# Altium footprint library ICs And Semiconductors SMD.PcbLib: 943 footprints (part 5 of 60)
Each footprint in its own frame and in the unit in brackets; x right, y up, seen from the top. Pads: shape width x height; smd on the part's side, far side on the other; paste and mask are expansions set on the pad; w line width, h text height; cw(c..) or ccw(c..) is an arc to the next point about the centre after c.
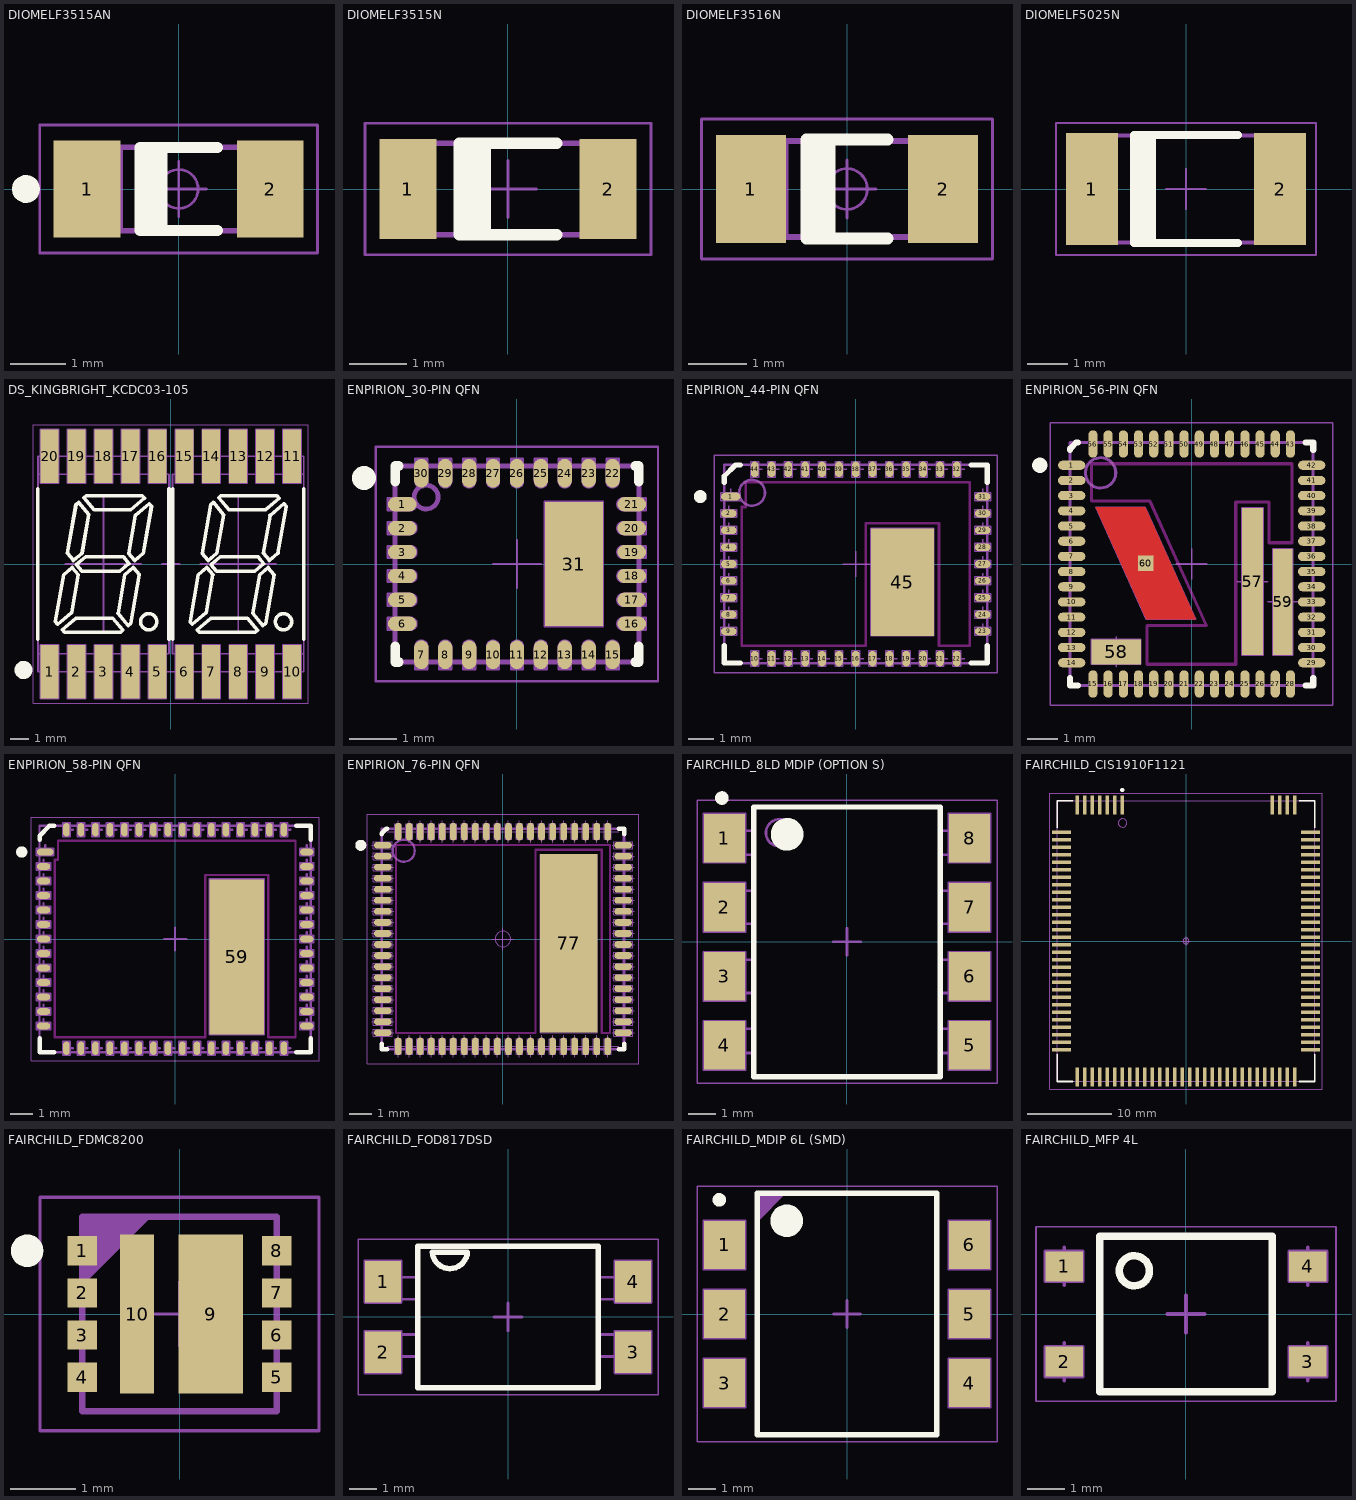
[diagram p4: the footprints below, top view; thin cyan lines are the x and y axes]

## DIOMELF3515AN [mm] "SOD80, MELF Diode, 2-Leads, Body 3.5x1.5mm, IPC Medium Density"
height 1.6
pads (2):
  rect 1.2x1.75 smd: 1(-1.65,0) 2(1.65,0)
Top Overlay:
  circle w0.25: c-2.75,0 r0.125
  lines w0.2: -0.5,-0.75 -0.5,0.75 ; -0.3,-0.75 -0.3,0.75 ; 0.7,-0.75 -0.7,-0.75 -0.7,0.75 0.7,0.75
Mechanical 14:
  lines w0.1: -1.65,-0.75 -1.65,0.75 ; -1.55,-0.75 -1.55,0.75 ; -1.45,-0.75 -1.45,0.75 ; -1.35,-0.75 -1.35,0.75 ; -1.25,-0.75 -1.25,0.75 ; -1.15,-0.75 -1.15,0.75 ; -1.05,-0.75 -1.05,0.75 ; -1.75,-0.75 1.75,-0.75 1.75,0.75 -1.75,0.75 ; -1.75,-0.75 -1.75,0.75 ; -1.75,-0.75 -1.75,0.75
Mechanical 15:
  circle w0.05: c0,0 r0.35
  lines w0.05: -0.5,0 0.5,0 ; 0,-0.5 0,0.5 ; -2.5,-1.15 2.5,-1.15 2.5,1.15 -2.5,1.15 -2.5,-1.15
3D body "DIOMELF3515AN.stp": height 1.6, standoff 0, extent -1.85,-0.8 1.85,0.8

## DIOMELF3515N [mm] "SOD80C, MELF Diode, 2-Leads, Body 3.5x1.5mm, IPC Medium Density"
height 1.6
pads (2):
  rect 1x1.75 smd: 1(-1.75,0) 2(1.75,0)
Top Overlay:
  rectangle: -0.85,-0.8 -0.3,0.8
  lines w0.2: 0.85,-0.8 -0.85,-0.8 -0.85,0.8 0.85,0.8
Mechanical 14:
  lines w0.1: -1.802,-0.8 -1.802,0.8 ; -1.727,-0.8 -1.727,0.8 ; -1.652,-0.8 -1.652,0.8 ; -1.577,-0.8 -1.577,0.8 ; -1.502,-0.8 -1.502,0.8 ; -1.427,-0.8 -1.427,0.8 ; -1.352,-0.8 -1.352,0.8 ; -1.85,-0.8 -1.85,0.8 1.85,0.8 1.85,-0.8 -1.85,-0.8
Mechanical 15:
  lines w0.05: -0.5,0 0.5,0 ; 0,-0.5 0,0.5 ; -2.5,-1.15 -2.5,1.15 2.5,1.15 2.5,-1.15 -2.5,-1.15
3D body "DIOMELF3515N.stp": height 1.6, standoff 0, extent -1.85,-0.8 1.85,0.8

## DIOMELF3516N [mm] "SOD80, Diode, MELF; 3.50mm L X 1.65mm Dia, IPC Medium Density"
height 1.6
pads (2):
  rect 1.2x1.85 smd: 1(-1.65,0) 2(1.65,0)
Top Overlay:
  lines w0.2: -0.5,-0.85 -0.5,0.85 ; -0.3,-0.85 -0.3,0.85 ; 0.7,-0.85 -0.7,-0.85 -0.7,0.85 0.7,0.85
Mechanical 14:
  lines w0.1: -1.65,-0.825 -1.65,0.825 ; -1.55,-0.825 -1.55,0.825 ; -1.45,-0.825 -1.45,0.825 ; -1.35,-0.825 -1.35,0.825 ; -1.25,-0.825 -1.25,0.825 ; -1.15,-0.825 -1.15,0.825 ; -1.05,-0.825 -1.05,0.825 ; -1.75,-0.825 1.75,-0.825 1.75,0.825 -1.75,0.825 ; -1.75,-0.825 -1.75,0.825 ; -1.75,-0.825 -1.75,0.825
Mechanical 15:
  circle w0.05: c0,0 r0.35
  lines w0.05: -0.5,0 0.5,0 ; 0,-0.5 0,0.5 ; -2.5,-1.2 2.5,-1.2 2.5,1.2 -2.5,1.2 -2.5,-1.2
3D body "DIOMELF3516N.stp": height 1.7, standoff 0, extent -1.85,-0.8 1.65,0.9

## DIOMELF5025N [mm] "DO-213-AB, MELF Diode, 2-Leads, Body 5.0x2.5mm, IPC Medium Density"
height 2.7
pads (2):
  rect 1.3x2.8 smd: 1(-2.35,0) 2(2.35,0)
Top Overlay:
  rectangle: -1.3,-1.35 -0.75,1.35
  lines w0.2: 1.3,-1.35 -1.3,-1.35 -1.3,1.35 1.3,1.35
Mechanical 14:
  lines w0.1: -2.5,-1.335 -2.5,1.335 ; -2.4,-1.335 -2.4,1.335 ; -2.3,-1.335 -2.3,1.335 ; -2.2,-1.335 -2.2,1.335 ; -2.1,-1.335 -2.1,1.335 ; -2,-1.335 -2,1.335 ; -2.6,-1.335 2.6,-1.335 2.6,1.335 -2.6,1.335 -2.6,-1.335
Mechanical 15:
  lines w0.05: -0.5,0 0.5,0 ; 0,-0.5 0,0.5 ; -3.25,-1.65 3.25,-1.65 3.25,1.65 -3.25,1.65 -3.25,-1.65
3D body "DIOMELF5025N.stp": height 2.67, standoff 0, extent -2.6,-1.335 2.6,1.335

## DS_KINGBRIGHT_KCDC03-105 [mm] "20-Leads, Body 14.8x12mm, Pitch 1.5mm, Hyper Red SMD Common Cathode Dual 7-SegmentDisplay"
height 1.2
pads (20):
  rect 1x3 smd: 1(-6.75,-6) 2(-5.25,-6) 3(-3.75,-6) 4(-2.25,-6) 5(-0.75,-6) 6(0.75,-6) 7(2.25,-6) 8(3.75,-6) 9(5.25,-6) 10(6.75,-6) 11(6.75,6) 12(5.25,6) 13(3.75,6) 14(2.25,6) 15(0.75,6) 16(-0.75,6) 17(-2.25,6) 18(-3.75,6) 19(-5.25,6) 20(-6.75,6)
Top Overlay:
  circle w0.2: c-1.227,-3.215 r0.45
  circle w0.2: c6.273,-3.215 r0.45
  circle w0.5: c-8.2,-5.9 r0.25
  lines w0.2: -0.1,-4.2 -0.1,4.2 ; 0.1,-4.2 0.1,4.2 ; -7.4,-4.2 -7.4,4.2 ; -7.4,-4.2 -7.4,4.2 ; -7.4,-4.2 -7.4,4.2 ; 7.4,-4.2 7.4,4.2 ; 7.4,-4.2 7.4,4.2 ; 7.4,-4.2 7.4,4.2 ; -6.425,-3.206 -6.301,-3.354 -5.524,-2.703 -5.153,-0.597 -5.489,-0.197 -5.965,-0.597 -6.425,-3.206 ; -6.034,-3.662 -5.909,-3.81 -2.815,-3.81 -2.667,-3.686 -3.233,-3.01 -5.257,-3.01 -6.034,-3.662 ; -5.755,0.597 -5.278,3.303 -5.129,3.428 -4.562,2.752 -4.942,0.597 -5.419,0.197 -5.755,0.597 ; -5.257,-0.035 -4.739,0.4 -2.643,0.4 -2.328,0.025 -2.834,-0.4 -4.95,-0.4 -5.257,-0.035 ; -4.833,3.686 -4.685,3.81 -1.591,3.81 -1.466,3.662 -2.243,3.01 -4.266,3.01 -4.833,3.686 ; -2.938,-2.752 -2.37,-3.428 -2.223,-3.304 -1.745,-0.597 -2.081,-0.197 -2.558,-0.597 -2.938,-2.752 ; -2.347,0.597 -1.976,2.703 -1.199,3.354 -1.075,3.206 -1.535,0.597 -2.011,0.197 -2.347,0.597 ; 1.075,-3.206 1.199,-3.354 1.976,-2.703 2.347,-0.597 2.011,-0.197 1.535,-0.597 1.075,-3.206 ; 1.466,-3.662 1.591,-3.81 4.685,-3.81 4.833,-3.686 4.267,-3.01 2.243,-3.01 1.466,-3.662 ; 1.745,0.597 2.222,3.303 2.371,3.428 2.938,2.752 2.558,0.597 2.081,0.197 1.745,0.597 ; 2.243,-0.035 2.761,0.4 4.857,0.4 5.172,0.025 4.666,-0.4 2.55,-0.4 2.243,-0.035 ; 2.667,3.686 2.815,3.81 5.909,3.81 6.034,3.662 5.257,3.01 3.234,3.01 2.667,3.686 ; 4.562,-2.752 5.13,-3.428 5.277,-3.304 5.755,-0.597 5.419,-0.197 4.942,-0.597 4.562,-2.752 ; 5.153,0.597 5.524,2.703 6.301,3.354 6.425,3.206 5.965,0.597 5.489,0.197 5.153,0.597
Mechanical 8:
  drawing of 172 lines, arcs and shapes, not listed
Mechanical 14:
  drawing of 422 lines, arcs and shapes, not listed
Mechanical 15:
  lines w0.05: -7.65,-7.75 -7.65,7.75 7.65,7.75 7.65,-7.75 -7.65,-7.75
3D body "DS_KINGBRIGHT_KCDC03-105.stp": height 3.75, standoff 0, extent -7.4,-6 7.4,6

## ENPIRION_30-PIN QFN [mm] "QFN, 0.50mm pitch, square; 30 pin, 5mm L X 4mm W X1.9mm H body (w/thermal tab 1.215mm x 2.6mm)"
height 1.9
pads (31):
  oval 0.6x0.3 smd: 1(-2.4,1.25) 2(-2.4,0.75) 3(-2.4,0.25) 4(-2.4,-0.25) 5(-2.4,-0.75) 6(-2.4,-1.25) 16(2.4,-1.25) 17(2.4,-0.75) 18(2.4,-0.25) 19(2.4,0.25) 20(2.4,0.75) 21(2.4,1.25)
  oval 0.3x0.6 smd: 7(-2,-1.9) 8(-1.5,-1.9) 9(-1,-1.9) 10(-0.5,-1.9) 11(0,-1.9) 12(0.5,-1.9) 13(1,-1.9) 14(1.5,-1.9) 15(2,-1.9) 22(2,1.9) 23(1.5,1.9) 24(1,1.9) 25(0.5,1.9) 26(0,1.9) 27(-0.5,1.9) 28(-1,1.9) 29(-1.5,1.9) 30(-2,1.9)
  rect 1.215x2.6 smd: 31(1.192,0)
Top Overlay:
  circle w0.25: c-3.2,1.8 r0.125
  lines w0.2: -2.55,-1.725 -2.55,-2.05 -2.475,-2.05 ; -2.55,1.725 -2.55,2.05 -2.475,2.05 ; 2.475,-2.05 2.55,-2.05 2.55,-1.725 ; 2.475,2.05 2.55,2.05 2.55,1.725
Mechanical 8:
  drawing of 193 lines, arcs and shapes, not listed
Mechanical 14:
  circle w0.1: c-1.9,1.4 r0.25
  lines w0.1: -2.55,-2.05 -2.55,2.05 2.55,2.05 2.55,-2.05 -2.55,-2.05
Mechanical 15:
  lines w0.05: -2.95,-2.45 -2.95,2.45 2.95,2.45 2.95,-2.45 -2.95,-2.45
3D body "ENPIRION_30-PIN QFN.stp": height 1.9, standoff 0, extent -2.55,-2.05 2.55,2.05

## ENPIRION_44-PIN QFN [mm] "QFN, 0.65mm pitch, square; 44 pin, 10mm L X 7.5mm W X 1.9mm H body (w/thermal tab 2.425mm x 4.15mm), IPC Medium Density"
height 1.9
pads (45):
  oval 0.75x0.3 smd: 1(-4.825,2.6)
  oval 0.6x0.3 smd: 2(-4.9,1.95) 3(-4.9,1.3) 4(-4.9,0.65) 5(-4.9,0) 6(-4.9,-0.65) 7(-4.9,-1.3) 8(-4.9,-1.95) 9(-4.9,-2.6) 23(4.9,-2.6) 24(4.9,-1.95) 25(4.9,-1.3) 26(4.9,-0.65) 27(4.9,0) 28(4.9,0.65) 29(4.9,1.3) 30(4.9,1.95) 31(4.9,2.6)
  oval 0.3x0.6 smd: 10(-3.9,-3.65) 11(-3.25,-3.65) 12(-2.6,-3.65) 13(-1.95,-3.65) 14(-1.3,-3.65) 15(-0.65,-3.65) 16(0,-3.65) 17(0.65,-3.65) 18(1.3,-3.65) 19(1.95,-3.65) 20(2.6,-3.65) 21(3.25,-3.65) 22(3.9,-3.65) 32(3.9,3.65) 33(3.25,3.65) 34(2.6,3.65) 35(1.95,3.65) 36(1.3,3.65) 37(0.65,3.65) 38(0,3.65) 39(-0.65,3.65) 40(-1.3,3.65) 41(-1.95,3.65) 42(-2.6,3.65) 43(-3.25,3.65) 44(-3.9,3.65)
  rect 2.425x4.15 smd: 45(1.801,-0.7)
Top Layer keep-out:
  lines w0.1: -4.4,-3.15 -4.4,2.2 -4.25,2.2 -4.25,3.15 4.4,3.15 4.4,-3.15 3.213,-3.15 3.213,1.575 0.388,1.575 0.388,-3.15 -4.4,-3.15
Top Overlay:
  circle w0.25: c-6,2.6 r0.125
  lines w0.2: -5.075,-3.225 -5.075,-3.825 ; -5.075,-3.15 -5.075,-3.825 ; -5.075,3.15 -5.075,3.385 ; -5.075,3.225 -5.075,3.385 ; -4.45,-3.825 -5.075,-3.825 ; -4.45,3.825 -4.635,3.825 -5.075,3.385 ; 4.45,-3.825 5.075,-3.825 5.075,-3.15 ; 4.45,3.825 5.075,3.825 5.075,3.15
Mechanical 8:
  drawing of 278 lines, arcs and shapes, not listed
Mechanical 14:
  circle w0.1: c-4,2.75 r0.5
  lines w0.1: -5.075,-3.825 -5.075,3.825 5.075,3.825 5.075,-3.825 -5.075,-3.825
Mechanical 15:
  lines w0.05: -5.45,-4.2 5.45,-4.2 5.45,4.2 -5.45,4.2 -5.45,-4.2
3D body "ENPIRION_44-PIN QFN.stp": height 1.9, standoff 0, extent -5.075,-3.825 5.075,3.825

## ENPIRION_56-PIN QFN [mm] "QFN, 0.50mm pitch, square; 56 pin, 8mm L X 8mm W X 3mm H body (w/multiple thermal tab)"
height 3.05
pads (60):
  oval 0.9x0.3 smd: 1(-3.95,3.25) 2(-3.95,2.75) 3(-3.95,2.25) 4(-3.95,1.75) 5(-3.95,1.25) 6(-3.95,0.75) 7(-3.95,0.25) 8(-3.95,-0.25) 9(-3.95,-0.75) 10(-3.95,-1.25) 11(-3.95,-1.75) 12(-3.95,-2.25) 13(-3.95,-2.75) 14(-3.95,-3.25) 29(3.95,-3.25) 30(3.95,-2.75) 31(3.95,-2.25) 32(3.95,-1.75) 33(3.95,-1.25) 34(3.95,-0.75) 35(3.95,-0.25) 36(3.95,0.25) 37(3.95,0.75) 38(3.95,1.25) 39(3.95,1.75) 40(3.95,2.25) 41(3.95,2.75) 42(3.95,3.25)
  oval 0.3x0.9 smd: 15(-3.25,-3.95) 16(-2.75,-3.95) 17(-2.25,-3.95) 18(-1.75,-3.95) 19(-1.25,-3.95) 20(-0.75,-3.95) 21(-0.25,-3.95) 22(0.25,-3.95) 23(0.75,-3.95) 24(1.25,-3.95) 25(1.75,-3.95) 26(2.25,-3.95) 27(2.75,-3.95) 28(3.25,-3.95) 43(3.25,3.95) 44(2.75,3.95) 45(2.25,3.95) 46(1.75,3.95) 47(1.25,3.95) 48(0.75,3.95) 49(0.25,3.95) 50(-0.25,3.95) 51(-0.75,3.95) 52(-1.25,3.95) 53(-1.75,3.95) 54(-2.25,3.95) 55(-2.75,3.95) 56(-3.25,3.95)
  rect 0.7x4.84 smd: 57(2,-0.577)
  rect 1.625x0.82 smd: 58(-2.488,-2.89)
  rect 0.65x3.5 smd: 59(3,-1.25)
  rect 0.5x0.5 smd: 60(-1.51,0.023)
Top Layer:
  region: -3.153,1.868 -1.522,1.868 -0.673,-0.025 0.133,-1.822 -1.498,-1.822
Top Layer keep-out:
  lines w0.1: 0.479,-2.021 -1.376,2.068 -3.3,2.068 -3.3,3.3 3.3,3.3 3.3,0.7 2.55,0.7 2.55,2.043 1.45,2.043 1.45,-3.3 -1.475,-3.3 -1.475,-2.022 0.481,-2.022
Top Overlay:
  circle w0.25: c-5,3.25 r0.125
  lines w0.2: -4,-3.75 -4,-4 -3.75,-4 ; -4,3.75 -4,3.8 -3.8,4 -3.75,4 ; 3.75,-4 4,-4 4,-3.75 ; 3.75,4 4,4 4,3.75
Mechanical 8:
  lines w0.05: -2.987,-2.89 -2.488,-2.89 ; -2.488,-3.39 -2.488,-2.89 ; -2.488,-2.39 -2.488,-2.89 ; -2.01,0.023 -1.51,0.023 ; -1.987,-2.89 -2.488,-2.89 ; -1.51,-0.477 -1.51,0.023 ; -1.51,0.523 -1.51,0.023 ; -1.01,0.023 -1.51,0.023 ; -0.5,0 0,0 ; 0,-0.5 0,0 ; 0,0.5 0,0 ; 0.5,0 0,0 ; 1.5,-0.577 2,-0.577 ; 2,-1.078 2,-0.577 ; 2,-0.078 2,-0.577 ; 2.5,-1.25 3,-1.25 ; 2.5,-0.577 2,-0.577 ; 3,-1.75 3,-1.25 ; 3,-0.75 3,-1.25 ; 3.5,-1.25 3,-1.25 ; -3.153,1.868 -1.522,1.868 ; -3.153,1.868 -1.498,-1.822 ; -3.153,1.868 -1.498,-1.822 ; -3.153,1.868 -1.522,1.868 ; -1.675,-3.3 -3.3,-3.3 -3.3,-2.48 -1.675,-2.48 ; -1.675,-3.3 -1.675,-2.48 ; -1.675,-3.3 -1.675,-2.48 ; -1.522,1.868 0.133,-1.822 ; -1.522,1.868 0.133,-1.822 ; -1.498,-1.822 0.133,-1.822 ; -1.498,-1.822 0.133,-1.822 ; 1.65,-3 2.35,-3 2.35,1.845 1.65,1.845 1.65,-3 ; 2.675,-3 3.325,-3 3.325,0.5 2.675,0.5 2.675,-3
Mechanical 14:
  circle w0.1: c-3,3 r0.5
  lines w0.1: -4,-4 -4,4 4,4 4,-4 -4,-4
Mechanical 15:
  lines w0.05: -4.65,-4.65 -4.65,4.65 4.65,4.65 4.65,-4.65 -4.65,-4.65
3D body "ENPIRION_56-PIN QFN.stp": height 3.05, standoff 0, extent -4,-4 4,4

## ENPIRION_58-PIN QFN [mm] "QFN, 0.65mm pitch, square; 58 pin, 12mm L X 10mm W X 1.95mm H body (w/thermal tab 6.955mm x 4.425mm), IPC Medium Density"
height 1.95
pads (59):
  oval 0.75x0.3 smd: 1(-5.825,3.9)
  oval 0.6x0.3 smd: 2(-5.9,3.25) 3(-5.9,2.6) 4(-5.9,1.95) 5(-5.9,1.3) 6(-5.9,0.65) 7(-5.9,0) 8(-5.9,-0.65) 9(-5.9,-1.3) 10(-5.9,-1.95) 11(-5.9,-2.6) 12(-5.9,-3.25) 13(-5.9,-3.9) 30(5.9,-3.9) 31(5.9,-3.25) 32(5.9,-2.6) 33(5.9,-1.95) 34(5.9,-1.3) 35(5.9,-0.65) 36(5.9,0) 37(5.9,0.65) 38(5.9,1.3) 39(5.9,1.95) 40(5.9,2.6) 41(5.9,3.25) 42(5.9,3.9)
  oval 0.3x0.6 smd: 14(-4.875,-4.9) 15(-4.225,-4.9) 16(-3.575,-4.9) 17(-2.925,-4.9) 18(-2.275,-4.9) 19(-1.625,-4.9) 20(-0.975,-4.9) 21(-0.325,-4.9) 22(0.325,-4.9) 23(0.975,-4.9) 24(1.625,-4.9) 25(2.275,-4.9) 26(2.925,-4.9) 27(3.575,-4.9) 28(4.225,-4.9) 29(4.875,-4.9) 43(4.875,4.9) 44(4.225,4.9) 45(3.575,4.9) 46(2.925,4.9) 47(2.275,4.9) 48(1.625,4.9) 49(0.975,4.9) 50(0.325,4.9) 51(-0.325,4.9) 52(-0.975,4.9) 53(-1.625,4.9) 54(-2.275,4.9) 55(-2.925,4.9) 56(-3.575,4.9) 57(-4.225,4.9) 58(-4.875,4.9)
  rect 2.425x6.95 smd: 59(2.763,-0.8)
Top Layer keep-out:
  lines w0.1: -5.4,-4.4 -5.4,3.55 -5.25,3.55 -5.25,4.4 5.4,4.4 5.4,-4.4 4.175,-4.4 4.175,2.875 1.35,2.875 1.35,-4.4 -5.4,-4.4
Top Overlay:
  circle w0.25: c-6.875,3.9 r0.125
  lines w0.2: -6.075,-4.45 -6.075,-5.075 -5.425,-5.075 ; -6.075,4.45 -6.075,4.635 -5.635,5.075 -5.425,5.075 ; 5.425,-5.075 6.075,-5.075 6.075,-4.45 ; 5.425,5.075 6.075,5.075 6.075,4.45
Top Paste:
  region: 2.183,0.45 3.343,0.45 3.343,2.35 2.183,2.35
  region: 2.183,-1.75 3.343,-1.75 3.343,0.15 2.183,0.15
  region: 2.183,-3.95 3.343,-3.95 3.343,-2.05 2.183,-2.05
Mechanical 8:
  drawing of 360 lines, arcs and shapes, not listed
Mechanical 14:
  lines w0.1: -6.075,-5.075 6.075,-5.075 6.075,5.075 -6.075,5.075 -6.075,-5.075
Mechanical 15:
  lines w0.05: -6.45,-5.45 -6.45,5.45 6.45,5.45 6.45,-5.45 -6.45,-5.45
3D body "ENPIRION_58-PIN QFN.stp": height 1.95, standoff 0, extent -6.075,-5.075 6.075,5.075

## ENPIRION_76-PIN QFN [mm] "QFP, 0.50mm Pitch, Square; 18 pin X 20 Pin, 10.00mm X 11.00mm (W/Thermal Tab 2.6mm X 8.1mm)"
height 3.05
pads (77):
  oval 0.8x0.3 smd: 1(-5.45,4.25) 2(-5.45,3.75) 3(-5.45,3.25) 4(-5.45,2.75) 5(-5.45,2.25) 6(-5.45,1.75) 7(-5.45,1.25) 8(-5.45,0.75) 9(-5.45,0.25) 10(-5.45,-0.25) 11(-5.45,-0.75) 12(-5.45,-1.25) 13(-5.45,-1.75) 14(-5.45,-2.25) 15(-5.45,-2.75) 16(-5.45,-3.25) 17(-5.45,-3.75) 18(-5.45,-4.25) 39(5.45,-4.25) 40(5.45,-3.75) 41(5.45,-3.25) 42(5.45,-2.75) 43(5.45,-2.25) 44(5.45,-1.75) 45(5.45,-1.25) 46(5.45,-0.75) 47(5.45,-0.25) 48(5.45,0.25) 49(5.45,0.75) 50(5.45,1.25) 51(5.45,1.75) 52(5.45,2.25) 53(5.45,2.75) 54(5.45,3.25) 55(5.45,3.75) 56(5.45,4.25)
  oval 0.3x0.8 smd: 19(-4.75,-4.867) 20(-4.25,-4.867) 21(-3.75,-4.867) 22(-3.25,-4.867) 23(-2.75,-4.867) 24(-2.25,-4.867) 25(-1.75,-4.867) 26(-1.25,-4.867) 27(-0.75,-4.867) 28(-0.25,-4.867) 29(0.25,-4.867) 30(0.75,-4.867) 31(1.25,-4.867) 32(1.75,-4.867) 33(2.25,-4.867) 34(2.75,-4.867) 35(3.25,-4.867) 36(3.75,-4.867) 37(4.25,-4.867) 38(4.75,-4.867) 57(4.75,4.867) 58(4.25,4.867) 59(3.75,4.867) 60(3.25,4.867) 61(2.75,4.867) 62(2.25,4.867) 63(1.75,4.867) 64(1.25,4.867) 65(0.75,4.867) 66(0.25,4.867) 67(-0.25,4.867) 68(-0.75,4.867) 69(-1.25,4.867) 70(-1.75,4.867) 71(-2.25,4.867) 72(-2.75,4.867) 73(-3.25,4.867) 74(-3.75,4.867) 75(-4.25,4.867) 76(-4.75,4.867)
  rect 2.6x8.1 smd: 77(2.98,-0.2)
Top Layer keep-out:
  lines w0.1: -4.85,-4.267 1.48,-4.267 1.48,4.05 4.48,4.05 4.48,-4.267 4.85,-4.267 4.85,4.267 -4.85,4.267 -4.85,-4.267
Top Overlay:
  circle w0.25: c-6.447,4.25 r0.125
  lines w0.2: -5.497,-4.75 -5.497,-5 -5.247,-5 ; -5.497,4.75 -5.497,4.8 -5.297,5 -5.247,5 ; 5.253,-5 5.503,-5 5.503,-4.75 ; 5.253,5 5.503,5 5.503,4.75
Top Paste:
  region: 2.18,-3.65 2.18,-2.35 3.779,-2.35 3.779,-3.65
  region: 2.18,-1.75 2.18,-0.45 3.779,-0.45 3.779,-1.75
  region: 2.18,0.05 2.18,1.35 3.779,1.35 3.779,0.05
  region: 2.18,1.95 2.18,3.25 3.779,3.25 3.779,1.95
Mechanical 8:
  drawing of 585 lines, arcs and shapes, not listed
Mechanical 14:
  circle w0.1: c-4.497,4 r0.5
  lines w0.1: -5.497,-5 -5.497,5 5.503,5 5.503,-5 -5.497,-5
Mechanical 15:
  lines w0.05: -6.147,-5.65 -6.147,5.65 6.153,5.65 6.153,-5.65 -6.147,-5.65
3D body "ENPIRION_76-PIN QFN.stp": height 3.05, standoff 0, extent -5.5,-5 5.5,5

## FAIRCHILD_8LD MDIP (OPTION S) [mm] "DIP Gull Wing Surface Mount, 8-Leads, Body 9.65x6.6mm, Pitch 2.54mm, FAIRCHILD 8LD MDIP"
height 5.08
pads (8):
  rect 1.52x1.78 smd: 1(-4.505,3.81) 2(-4.505,1.27) 3(-4.505,-1.27) 4(-4.505,-3.81) 5(4.505,-3.81) 6(4.505,-1.27) 7(4.505,1.27) 8(4.505,3.81)
Top Overlay:
  circle w0.25: c-4.6,5.285 r0.125
  circle w0.6: c-2.2,3.95 r0.3
  lines w0.2: -3.43,-4.955 3.43,-4.955 3.43,4.955 -3.43,4.955 -3.43,-4.955
Mechanical 8:
  lines w0.1: -5.005,-3.81 -4.505,-3.81 ; -5.005,-1.27 -4.505,-1.27 ; -5.005,1.27 -4.505,1.27 ; -5.005,3.81 -4.505,3.81 ; -4.505,-4.31 -4.505,-3.81 ; -4.505,-3.31 -4.505,-3.81 ; -4.505,-1.77 -4.505,-1.27 ; -4.505,-0.77 -4.505,-1.27 ; -4.505,0.77 -4.505,1.27 ; -4.505,1.77 -4.505,1.27 ; -4.505,3.31 -4.505,3.81 ; -4.505,4.31 -4.505,3.81 ; -4.005,-3.81 -4.505,-3.81 ; -4.005,-1.27 -4.505,-1.27 ; -4.005,1.27 -4.505,1.27 ; -4.005,3.81 -4.505,3.81 ; -0.5,0 0,0 ; 0,-0.5 0,0 ; 0,0.5 0,0 ; 0.5,0 0,0 ; 4.005,-3.81 4.505,-3.81 ; 4.005,-1.27 4.505,-1.27 ; 4.005,1.27 4.505,1.27 ; 4.005,3.81 4.505,3.81 ; 4.505,-4.31 4.505,-3.81 ; 4.505,-3.31 4.505,-3.81 ; 4.505,-1.77 4.505,-1.27 ; 4.505,-0.77 4.505,-1.27 ; 4.505,0.77 4.505,1.27 ; 4.505,1.77 4.505,1.27 ; 4.505,3.31 4.505,3.81 ; 4.505,4.31 4.505,3.81 ; 5.005,-3.81 4.505,-3.81 ; 5.005,-1.27 4.505,-1.27 ; 5.005,1.27 4.505,1.27 ; 5.005,3.81 4.505,3.81 ; -5.265,-4.7 -5.265,-2.92 -3.745,-2.92 -3.745,-4.7 -5.265,-4.7 ; -5.265,-2.16 -5.265,-0.38 -3.745,-0.38 -3.745,-2.16 -5.265,-2.16 ; -5.265,0.38 -5.265,2.16 -3.745,2.16 -3.745,0.38 -5.265,0.38 ; -5.265,2.92 -5.265,4.7 -3.745,4.7 -3.745,2.92 -5.265,2.92 ; 3.745,-4.7 3.745,-2.92 5.265,-2.92 5.265,-4.7 3.745,-4.7 ; 3.745,-2.16 3.745,-0.38 5.265,-0.38 5.265,-2.16 3.745,-2.16 ; 3.745,0.38 3.745,2.16 5.265,2.16 5.265,0.38 3.745,0.38 ; 3.745,2.92 3.745,4.7 5.265,4.7 5.265,2.92 3.745,2.92
Mechanical 14:
  circle w0.1: c-2.48,4.005 r0.5
  lines w0.1: -3.43,-4.085 -5.15,-4.085 -5.15,-3.535 -4.957,-3.535 -4.764,-3.2 -3.43,-3.2 ; -3.43,-1.88 -4.764,-1.88 -4.957,-1.545 -5.15,-1.545 -5.15,-0.995 -4.957,-0.995 -4.764,-0.66 -3.43,-0.66 ; -3.43,0.66 -4.764,0.66 -4.957,0.995 -5.15,0.995 -5.15,1.545 -4.957,1.545 -4.764,1.88 -3.43,1.88 ; -3.43,3.2 -4.764,3.2 -4.957,3.535 -5.15,3.535 -5.15,4.085 -3.43,4.085 ; 3.43,-4.085 5.15,-4.085 5.15,-3.535 4.957,-3.535 4.764,-3.2 3.43,-3.2 ; 3.43,-1.88 4.764,-1.88 4.957,-1.545 5.15,-1.545 5.15,-0.995 4.957,-0.995 4.764,-0.66 3.43,-0.66 ; 3.43,0.66 4.764,0.66 4.957,0.995 5.15,0.995 5.15,1.545 4.957,1.545 4.764,1.88 3.43,1.88 ; 3.43,3.2 4.764,3.2 4.957,3.535 5.15,3.535 5.15,4.085 3.43,4.085 ; -3.43,-4.955 3.43,-4.955 3.43,4.955 -3.43,4.955 -3.43,-4.955
Mechanical 15:
  lines w0.05: -5.515,-5.205 5.515,-5.205 5.515,5.205 -5.515,5.205 -5.515,-5.205
3D body "FAIRCHILD_8LD MDIP (OPTION S).stp": height 5.08, standoff 0, extent -5.15,-4.955 5.15,4.955

## FAIRCHILD_CIS1910F1121 [mm] "LCC, 0.889mm Pitch, Rect.; 101 Pin, 33.274mm L X 30.48mm W X 3.35mm H Body, FAIRCHILD LCC101"
height 4.11
pads (101):
  rect 0.4x2.25 smd: 1(-7.556,16.15) 2(-8.445,16.15) 3(-9.335,16.15) 4(-10.223,16.15) 5(-11.112,16.15) 6(-12.002,16.15) 7(-12.89,16.15) 38(-12.89,-16.15) 39(-12.002,-16.15) 40(-11.112,-16.15) 41(-10.223,-16.15) 42(-9.335,-16.15) 43(-8.445,-16.15) 44(-7.556,-16.15) 45(-6.667,-16.15) 46(-5.779,-16.15) 47(-4.889,-16.15) 48(-4,-16.15) 49(-3.111,-16.15) 50(-2.222,-16.15) 51(-1.333,-16.15) 52(-0.445,-16.15) 53(0.445,-16.15) 54(1.333,-16.15) 55(2.222,-16.15) 56(3.111,-16.15) 57(4,-16.15) 58(4.889,-16.15) 59(5.779,-16.15) 60(6.667,-16.15) 61(7.556,-16.15) 62(8.445,-16.15) 63(9.335,-16.15) 64(10.223,-16.15) 65(11.112,-16.15) 66(12.002,-16.15) 67(12.89,-16.15) 98(12.89,16.15) 99(12.002,16.15) 100(11.112,16.15) 101(10.223,16.15)
  rect 2.25x0.4 smd: 8(-14.75,12.89) 9(-14.75,12.002) 10(-14.75,11.112) 11(-14.75,10.223) 12(-14.75,9.335) 13(-14.75,8.445) 14(-14.75,7.556) 15(-14.75,6.667) 16(-14.75,5.779) 17(-14.75,4.889) 18(-14.75,4) 19(-14.75,3.111) 20(-14.75,2.222) 21(-14.75,1.333) 22(-14.75,0.445) 23(-14.75,-0.445) 24(-14.75,-1.333) 25(-14.75,-2.222) 26(-14.75,-3.111) 27(-14.75,-4) 28(-14.75,-4.889) 29(-14.75,-5.779) 30(-14.75,-6.667) 31(-14.75,-7.556) 32(-14.75,-8.445) 33(-14.75,-9.335) 34(-14.75,-10.223) 35(-14.75,-11.112) 36(-14.75,-12.002) 37(-14.75,-12.89) 68(14.75,-12.89) 69(14.75,-12.002) 70(14.75,-11.112) 71(14.75,-10.223) 72(14.75,-9.335) 73(14.75,-8.445) 74(14.75,-7.556) 75(14.75,-6.667) 76(14.75,-5.779) 77(14.75,-4.889) 78(14.75,-4) 79(14.75,-3.111) 80(14.75,-2.222) 81(14.75,-1.333) 82(14.75,-0.445) 83(14.75,0.445) 84(14.75,1.333) 85(14.75,2.222) 86(14.75,3.111) 87(14.75,4) 88(14.75,4.889) 89(14.75,5.779) 90(14.75,6.667) 91(14.75,7.556) 92(14.75,8.445) 93(14.75,9.335) 94(14.75,10.223) 95(14.75,11.112) 96(14.75,12.002) 97(14.75,12.89)
Top Overlay:
  circle w0.25: c-7.557,17.9 r0.125
  lines w0.2: -15.25,-13.45 -15.25,-16.65 -13.45,-16.65 ; -15.25,13.45 -15.25,16.65 -13.45,16.65 ; 13.45,-16.65 15.25,-16.65 15.25,-13.45 ; 13.45,16.65 15.25,16.65 15.25,13.45
Mechanical 14:
  circle w0.1: c-7.525,14 r0.5
  lines w0.1: -15.24,-16.637 15.24,-16.637 15.24,16.637 -15.24,16.637 -15.24,-16.637
Mechanical 15:
  circle w0.05: c0,0 r0.35
  lines w0.05: -0.5,0 0.5,0 ; 0,-0.5 0,0.5 ; -16.15,-17.55 16.15,-17.55 16.15,17.55 -16.15,17.55 -16.15,-17.55
3D body "FAIRCHILD_CIS1910F1121_Part1.stp": height 3.35, standoff 0, extent -15.24,-16.637 15.24,16.637
3D body "FAIRCHILD_CIS1910F1121_Part2.stp": height 4.29, standoff 3.3, extent -12.662,-9.068 12.662,14.402

## FAIRCHILD_FDMC8200 [mm] "SON, 0.50mm Pitch; 8 Pin, 3.00mm W X 3.00mm L X 0.8mm H body, 2x Thermal Pad, IPC Medium Density"
height 0.8
pads (10):
  rect 0.45x0.45 smd: 1(-1.5,0.975) 2(-1.5,0.325) 3(-1.5,-0.325) 4(-1.5,-0.975) 5(1.5,-0.975) 6(1.5,-0.325) 7(1.5,0.325) 8(1.5,0.975)
  rect 0.99x2.45 smd paste-0.35: 9(0.48,0)
  rect 0.52x2.45 smd paste-0.35: 10(-0.655,0)
Top Overlay:
  circle w0.25: c-2.35,0.975 r0.125
Mechanical 8:
  lines w0.05: -0.5,0 0,0 ; -0.02,0 0.48,0 ; 0,-0.5 0,0 ; 0,0.5 0,0 ; 0.5,0 0,0
Mechanical 14:
  lines w0.1: -1.5,0.5 -0.5,1.5 ; -1.5,0.6 -0.6,1.5 ; -1.5,0.7 -0.7,1.5 ; -1.5,0.8 -0.8,1.5 ; -1.5,0.9 -0.9,1.5 ; -1.5,1 -1,1.5 ; -1.5,1.1 -1.1,1.5 ; -1.5,1.2 -1.2,1.5 ; -1.5,1.3 -1.3,1.5 ; -1.5,1.4 -1.4,1.5 ; -1.5,-1.5 1.5,-1.5 1.5,1.5 -1.5,1.5 -1.5,-1.5
Mechanical 15:
  lines w0.05: -2.15,-1.8 -2.15,1.8 2.15,1.8 2.15,-1.8 -2.15,-1.8
3D body "FAIRCHILD_FDMC8200.stp": height 0.8, standoff 0, extent -1.5,-1.5 1.5,1.5

## FAIRCHILD_FOD817DSD [mm] "SOIC, 2.54mm Pitch, 4 Pin, Body 6.5mm W X 4.6mm L X 4.6mm H"
height 5.08
pads (4):
  rect 1.3x1.5 smd: 1(-4.5,1.27) 2(-4.5,-1.27) 3(4.5,-1.27) 4(4.5,1.27)
Top Overlay:
  lines w0.2: -3.25,-2.55 -3.25,2.55 3.25,2.55 3.25,-2.55 -3.25,-2.55 ; -2.728,2.334 ccw(c-2.094,2.374) -1.46,2.334 -2.728,2.334
Mechanical 8:
  lines w0.1: -5,-1.27 -4.5,-1.27 ; -5,1.27 -4.5,1.27 ; -4.5,-1.77 -4.5,-1.27 ; -4.5,-0.77 -4.5,-1.27 ; -4.5,0.77 -4.5,1.27 ; -4.5,1.77 -4.5,1.27 ; -4,-1.27 -4.5,-1.27 ; -4,1.27 -4.5,1.27 ; -0.5,0 0,0 ; 0,-0.5 0,0 ; 0,0.5 0,0 ; 0.5,0 0,0 ; 4,-1.27 4.5,-1.27 ; 4,1.27 4.5,1.27 ; 4.5,-1.77 4.5,-1.27 ; 4.5,-0.77 4.5,-1.27 ; 4.5,0.77 4.5,1.27 ; 4.5,1.77 4.5,1.27 ; 5,-1.27 4.5,-1.27 ; 5,1.27 4.5,1.27 ; -5.15,-2.02 -3.85,-2.02 -3.85,-0.52 -5.15,-0.52 -5.15,-2.02 ; -5.15,0.52 -3.85,0.52 -3.85,2.02 -5.15,2.02 -5.15,0.52 ; 3.85,-2.02 5.15,-2.02 5.15,-0.52 3.85,-0.52 3.85,-2.02 ; 3.85,0.52 5.15,0.52 5.15,2.02 3.85,2.02 3.85,0.52
Mechanical 14:
  lines w0.1: -3.25,-1.425 -3.855,-1.425 -3.855,-1.905 -5.015,-1.905 -5.015,-0.635 -3.25,-0.635 ; -3.25,0.635 -5.015,0.635 -5.015,1.905 -3.855,1.905 -3.855,1.425 -3.25,1.425 ; 3.25,-1.425 3.855,-1.425 3.85,-1.905 5.015,-1.905 5.015,-0.635 3.25,-0.635 ; 3.25,0.635 5.015,0.635 5.015,1.905 3.855,1.905 3.855,1.425 3.25,1.425 ; -3.25,-2.55 -3.25,2.55 3.25,2.55 3.25,-2.55 -3.25,-2.55 ; -2.728,2.334 ccw(c-2.094,2.374) -1.46,2.334 -2.728,2.334
Mechanical 15:
  lines w0.05: -5.4,-2.8 -5.4,2.8 5.4,2.8 5.4,-2.8 -5.4,-2.8
3D body "FAIRCHILD_FOD817DSD.stp": height 4.06, standoff 0, extent -5.015,-2.55 5.015,2.55

## FAIRCHILD_MDIP 6L (SMD) [mm] "SOIC, 2.54mm Pitch, 6 Pin, Body 6.35mm W X 8.5mm L X 5.08mm H, FAIRCHILD MDIP 6L"
height 5.08
pads (6):
  rect 1.52x1.78 smd: 1(-4.508,2.54) 2(-4.508,0) 3(-4.508,-2.54) 4(4.508,-2.54) 5(4.508,0) 6(4.508,2.54)
Top Overlay:
  circle w0.25: c-4.7,4.2 r0.125
  circle w0.6: c-2.22,3.43 r0.3
  lines w0.2: -3.3,-4.445 -3.3,4.445 3.3,4.445 3.3,-4.445 -3.3,-4.445
Mechanical 8:
  lines w0.1: -5.008,-2.54 -4.508,-2.54 ; -5.008,0 -4.508,0 ; -5.008,2.54 -4.508,2.54 ; -4.508,-3.04 -4.508,-2.54 ; -4.508,-2.04 -4.508,-2.54 ; -4.508,-0.5 -4.508,0 ; -4.508,0.5 -4.508,0 ; -4.508,2.04 -4.508,2.54 ; -4.508,3.04 -4.508,2.54 ; -4.008,-2.54 -4.508,-2.54 ; -4.008,0 -4.508,0 ; -4.008,2.54 -4.508,2.54 ; -0.5,0 0,0 ; 0,-0.5 0,0 ; 0,0.5 0,0 ; 0.5,0 0,0 ; 4.008,-2.54 4.508,-2.54 ; 4.008,0 4.508,0 ; 4.008,2.54 4.508,2.54 ; 4.508,-3.04 4.508,-2.54 ; 4.508,-2.04 4.508,-2.54 ; 4.508,-0.5 4.508,0 ; 4.508,0.5 4.508,0 ; 4.508,2.04 4.508,2.54 ; 4.508,3.04 4.508,2.54 ; 5.008,-2.54 4.508,-2.54 ; 5.008,0 4.508,0 ; 5.008,2.54 4.508,2.54 ; -5.27,-3.43 -3.745,-3.43 -3.745,-1.65 -5.27,-1.65 -5.27,-3.43 ; -5.27,-0.89 -3.745,-0.89 -3.745,0.89 -5.27,0.89 -5.27,-0.89 ; -5.27,1.65 -3.745,1.65 -3.745,3.43 -5.27,3.43 -5.27,1.65 ; 3.745,-3.43 5.27,-3.43 5.27,-1.65 3.745,-1.65 3.745,-3.43 ; 3.745,-0.89 5.27,-0.89 5.27,0.89 3.745,0.89 3.745,-0.89 ; 3.745,1.65 5.27,1.65 5.27,3.43 3.745,3.43 3.745,1.65
Mechanical 14:
  lines w0.1: -3.3,3.445 -2.3,4.445 ; -3.3,3.545 -2.4,4.445 ; -3.3,3.645 -2.5,4.445 ; -3.3,3.745 -2.6,4.445 ; -3.3,3.845 -2.7,4.445 ; -3.3,3.945 -2.8,4.445 ; -3.3,4.045 -2.9,4.445 ; -3.3,4.145 -3,4.445 ; -3.3,4.245 -3.1,4.445 ; -3.3,4.345 -3.2,4.445 ; -3.3,-4.445 -3.3,4.445 3.3,4.445 3.3,-4.445 -3.3,-4.445
Mechanical 15:
  lines w0.05: -5.52,-4.695 -5.52,4.695 5.52,4.695 5.52,-4.695 -5.52,-4.695
3D body "FAIRCHILD_MDIP 6L (SMD).stp": height 5.08, standoff 0, extent -4.946,-4.445 4.947,4.445

## FAIRCHILD_MFP 4L [mm] "4-Leads Surface Mount SOIC Package, Body 5.3x4.4mm, Pitch 2.54mm"
height 2.4
pads (4):
  rect 1x0.8 smd: 1(-3.25,1.27) 2(-3.25,-1.27) 3(3.25,-1.27) 4(3.25,1.27)
Top Overlay:
  circle w0.2: c-1.377,1.152 r0.4
  lines w0.2: -2.3,-2.075 -2.3,2.075 2.3,2.075 2.3,-2.075 -2.3,-2.075
Mechanical 8:
  lines w0.1: -3.75,-1.27 -3.25,-1.27 ; -3.75,1.27 -3.25,1.27 ; -3.25,-1.77 -3.25,-1.27 ; -3.25,-0.77 -3.25,-1.27 ; -3.25,0.77 -3.25,1.27 ; -3.25,1.77 -3.25,1.27 ; -2.75,-1.27 -3.25,-1.27 ; -2.75,1.27 -3.25,1.27 ; -0.5,0 0,0 ; 0,-0.5 0,0 ; 0,0.5 0,0 ; 0.5,0 0,0 ; 2.75,-1.27 3.25,-1.27 ; 2.75,1.27 3.25,1.27 ; 3.25,-1.77 3.25,-1.27 ; 3.25,-0.77 3.25,-1.27 ; 3.25,0.77 3.25,1.27 ; 3.25,1.77 3.25,1.27 ; 3.75,-1.27 3.25,-1.27 ; 3.75,1.27 3.25,1.27 ; -3.75,-1.67 -2.75,-0.87 ; -3.75,-1.67 -2.75,-1.67 -2.75,-0.87 ; -3.75,-1.67 -3.75,-0.87 -2.75,-0.87 ; -3.75,0.87 -2.75,1.67 ; -3.75,0.87 -2.75,0.87 -2.75,1.67 ; -3.75,0.87 -3.75,1.67 -2.75,1.67 ; 2.75,-1.67 3.75,-1.67 3.75,-0.87 2.75,-0.87 2.75,-1.67 ; 2.75,0.87 3.75,0.87 3.75,1.67 2.75,1.67 2.75,0.87
Mechanical 14:
  circle w0.1: c-1.377,1.152 r0.4
  lines w0.1: -2.3,-2.075 -2.3,2.075 2.3,2.075 2.3,-2.075 -2.3,-2.075
Mechanical 15:
  lines w0.05: -4,-2.325 4,-2.325 4,2.325 -4,2.325 -4,-2.325
3D body "FAIRCHILD_MFP 4L.stp": height 2.4, standoff 0, extent -3.514,-2.075 3.514,2.075